# Altium footprint library KwantLib.PcbLib: 249 footprints (part 15 of 16)
Each footprint in its own frame and in the unit in brackets; x right, y up, seen from the top. Pads: shape width x height; smd on the part's side, far side on the other; paste and mask are expansions set on the pad; w line width, h text height; cw(c..) or ccw(c..) is an arc to the next point about the centre after c.
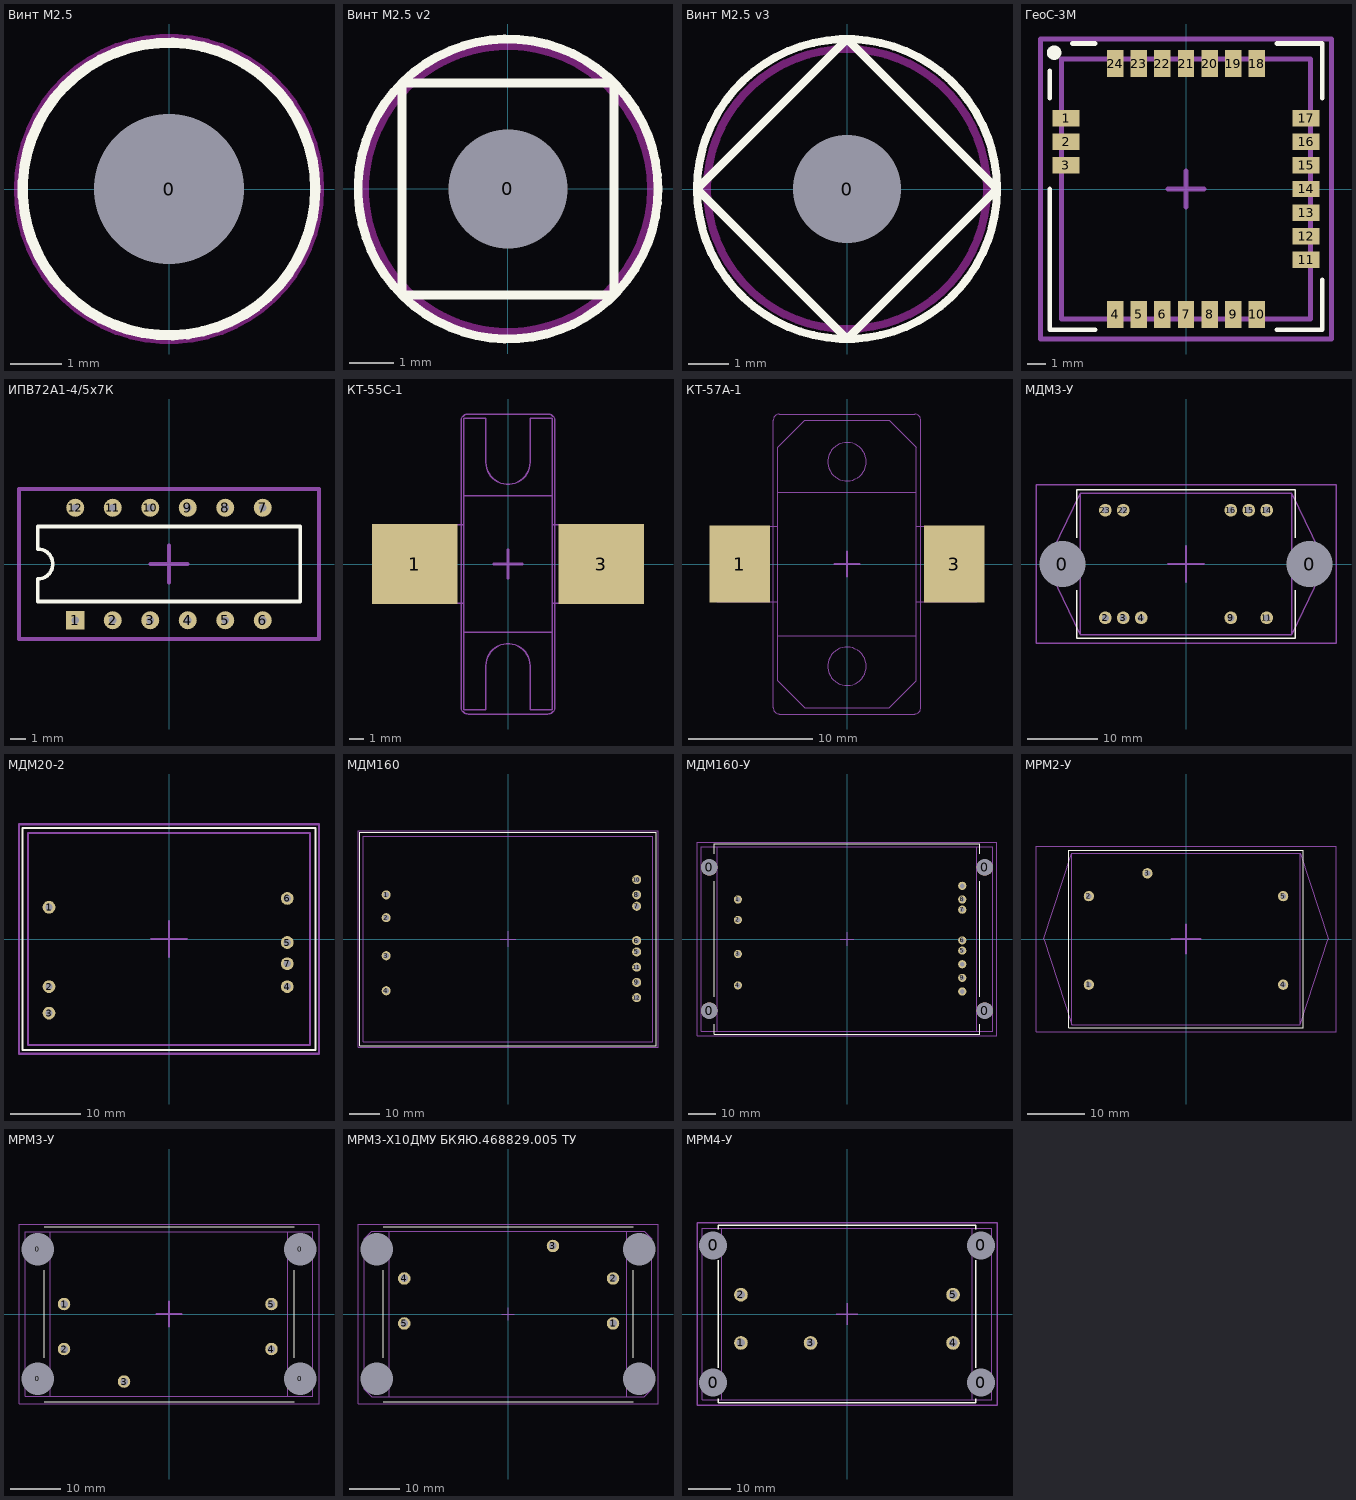
[diagram p14: the footprints below, top view; thin cyan lines are the x and y axes]

## WSON6-Big [mm]
height 0.8

## Винт М2.5 [mm] "Винт М2.5"
height 1.5
pads (1):
  round 2 hole 2.9 unplated: 0(0,0)
Top Overlay:
  circle w0.2: c0,0 r2.828
Keep-Out Layer:
  circle w0.2: c0,0 r2.9

## Винт М2.5 v2 [mm] "Винт М2.5, внутренний 2.7, внешний 6.5мм"
height 1.5
pads (1):
  round 2 hole 2.7 unplated: 0(0,0)
Top Overlay:
  circle w0.2: c0,0 r3.4
  lines w0.2: -2.404,-2.404 2.404,-2.404 2.404,2.404 -2.404,2.404 -2.404,-2.404
Keep-Out Layer:
  circle w0.2: c0,0 r3.25

## Винт М2.5 v3 [mm] "Винт М2.5, внутренний 2.7, внешний 7.5мм"
height 1.5
pads (1):
  round 2 hole 2.7 unplated: 0(0,0)
Top Overlay:
  circle w0.2: c0,0 r3.75
  lines w0.2: -3.75,0 0,3.75 3.75,0 0,-3.75 -3.75,0
Keep-Out Layer:
  circle w0.2: c0,0 r3.5

## ГеоС-3М [mm] "GPS - Glonass module"
pads (24):
  rect 1.5x0.9 smd: 1(-6.6,3.9) 2(-6.6,2.6) 3(-6.6,1.3) 11(6.6,-3.9) 12(6.6,-2.6) 13(6.6,-1.3) 14(6.6,0) 15(6.6,1.3) 16(6.6,2.6) 17(6.6,3.9)
  rect 0.9x1.5 smd: 4(-3.9,-6.9) 5(-2.6,-6.9) 6(-1.3,-6.9) 7(0,-6.9) 8(1.3,-6.9) 9(2.6,-6.9) 10(3.9,-6.9) 18(3.9,6.9) 19(2.6,6.9) 20(1.3,6.9) 21(0,6.9) 22(-1.3,6.9) 23(-2.6,6.9) 24(-3.9,6.9)
Top Overlay:
  circle w0.4: c-7.25,7.5 r0.2
  lines w0.254: -7.5,0 -7.5,-7.75 -5,-7.75 ; -7.5,5 -7.5,6.5 ; -6.25,8 -5,8 ; 5,-7.75 7.5,-7.75 7.5,-5 ; 5,8 7.5,8 7.5,5
Mechanical 13:
  lines w0.254: -6.85,-7.15 -6.85,7.15 6.85,7.15 6.85,-7.15 -6.85,-7.15
Mechanical 15:
  lines w0.254: -1,0 1,0 ; 0,-1 0,1 ; -8,-8.25 -8,8.25 8,8.25 8,-8.25 -8,-8.25
3D body "geos-3m_3d.step": height 2.65, standoff -0.04, extent -6.85,-7.15 6.85,7.15

## ИПВ72А1-4/5х7К [mm]
height 6
pads (12):
  rect 1.2x1.2 hole 0.5 unplated: 1(-6.25,-3.75)
  round 1.2 hole 0.5 unplated: 2(-3.75,-3.75) 3(-1.25,-3.75) 4(1.25,-3.75) 5(3.75,-3.75) 6(6.25,-3.75) 7(6.25,3.75) 8(3.75,3.75) 9(1.25,3.75) 10(-1.25,3.75) 11(-3.75,3.75) 12(-6.25,3.75)
Top Overlay:
  lines w0.25: -8.75,-2.5 -8.75,-1 ccw(c-8.75,0) -8.75,1 -8.75,2.5 8.75,2.5 8.75,-2.5 -8.75,-2.5
Mechanical 13:
  lines w0.25: -10,-5 10,-5 10,5 -10,5 -10,-5
Mechanical 15:
  lines w0.25: -1.25,0 1.25,0 ; 0,-1.25 0,1.25 ; -10,-5 10,-5 10,5 -10,5 -10,-5
3D body: height 6, standoff 0.01, extent -10,-5 10,5

## КТ-55С-1 [mm]
pads (2):
  rect 6x5.6 smd mask+0.07: 1(-6.55,0) 3(6.55,0)
Mechanical 13:
  lines w0.1: -3.1,-2.775 -9,-2.775 -9,2.775 -3.1,2.775 ; 3.1,-2.775 9,-2.775 9,0.025 6.25,2.775 3.1,2.775 ; -3.1,-4.8 -3.1,4.8 ; -3.1,-4.8 3.1,-4.8 ; -3.1,-4.8 -3.1,-10.25 -1.55,-10.25 -1.55,-7.15 cw(c0,-7.15) 1.55,-7.15 1.55,-10.25 3.1,-10.25 3.1,-4.8 ; -3.1,4.8 3.1,4.8 ; -3.1,4.8 -3.1,10.25 -1.55,10.25 -1.55,7.15 ccw(c0,7.15) 1.55,7.15 1.55,10.25 3.1,10.25 3.1,4.8 ; 3.1,-4.8 3.1,4.8
Mechanical 15:
  lines w0.1: -3.3,-10.05 ccw(c-2.8,-10.05) -2.8,-10.55 2.8,-10.55 ccw(c2.8,-10.05) 3.3,-10.05 3.3,10.05 ccw(c2.8,10.05) 2.8,10.55 -2.8,10.55 ccw(c-2.8,10.05) -3.3,10.05 -3.3,-10.05
  lines w0.2: -1,0 1,0 ; 0,-1 0,1
3D body "2П986А.stp": height 2.2, standoff -2.3, extent -9,-10.25 9,10.25

## КТ-57A-1 [mm]
pads (2):
  rect 4.9x6.2 smd mask+0.07: 1(-8.65,0) 3(8.65,0)
Mechanical 13:
  circle w0.1: c0,8.25 r1.55
  circle w0.1: c0,-8.25 r1.55
  lines w0.1: -5.6,-3.05 -10.5,-3.05 -10.5,3.05 -5.6,3.05 ; 5.6,-3.05 10.5,-3.05 10.5,2.05 9.5,3.05 5.6,3.05 ; -5.6,-5.8 5.6,-5.8 ; -5.6,-5.8 -5.6,5.8 ; -5.6,-5.8 -5.6,-9.4 -3.4,-11.6 3.4,-11.6 5.6,-9.4 5.6,-5.8 ; -5.6,5.8 5.6,5.8 ; -5.6,5.8 -5.6,9.4 -3.4,11.6 3.4,11.6 5.6,9.4 5.6,5.8 ; 5.6,-5.8 5.6,5.8
Mechanical 15:
  lines w0.1: -5.95,-11.6 ccw(c-5.45,-11.6) -5.45,-12.1 5.45,-12.1 ccw(c5.45,-11.6) 5.95,-11.6 5.95,11.6 ccw(c5.45,11.6) 5.45,12.1 -5.45,12.1 ccw(c-5.45,11.6) -5.95,11.6 -5.95,-11.6
  lines w0.2: -1,0 1,0 ; 0,-1 0,1
3D body "2П986Г.stp": height 2.7, standoff -3.1, extent -10.5,-11.6 10.5,11.6

## МДМ3-У [mm]
height 8
pads (12):
  round 5 hole 6.5 unplated: 0(-17.5,0) 0(17.5,0)
  round 1.8 hole 1: 2(-11.43,-7.62) 3(-8.89,-7.62) 4(-6.35,-7.62) 9(6.35,-7.62) 11(11.43,-7.62) 14(11.43,7.62) 15(8.89,7.62) 16(6.35,7.62) 22(-8.89,7.62) 23(-11.43,7.62)
Top Overlay:
  lines w0.2: -15.5,-3.75 -15.5,-10.5 15.5,-10.5 15.5,-3.75 ; -15.5,3.75 -15.5,10.5 15.5,10.5 15.5,3.75
Mechanical 13:
  circle w0.2: c17.5,0 r1.5
  circle w0.2: c-17.5,0 r1.5
  lines w0.1: -19.25,0 -15.75,0 ; -17.5,-1.75 -17.5,1.75 ; 15.75,0 19.25,0 ; 17.5,-1.75 17.5,1.75
  lines w0.2: -15,-10 15,-10 ; -15,-10 -19.764,0 -15,10 ; -15,-10 -15,10 ; -15,10 15,10 ; 15,-10 19.764,0 15,10 ; 15,-10 15,10
Mechanical 15:
  lines w0.2: -21.25,-11.25 -21.25,11.25 21.25,11.25 21.25,-11.25 -21.25,-11.25
  lines w0.35: -2.5,0 2.5,0 ; 0,-2.5 0,2.5
3D body "МДМ3.stp": height 8.1, standoff -3.4, extent -19.764,-10 19.764,10

## МДМ20-2 [mm]
height 9
pads (7):
  round 1.8 hole 1 unplated: 1(-17,4.5) 2(-17,-6.75) 3(-17,-10.5) 4(16.75,-6.75) 5(16.75,-0.5) 6(16.75,5.75) 7(16.75,-3.5)
Top Overlay:
  lines w0.3: -20.75,-15.75 20.75,-15.75 20.75,15.75 -20.75,15.75 -20.75,-15.75
Mechanical 13:
  lines w0.3: -20,-15 20,-15 20,15 -20,15 -20,-15
Mechanical 15:
  lines w0.3: -21.25,-16.25 21.25,-16.25 21.25,16.25 -21.25,16.25 -21.25,-16.25
  lines w0.35: -2.5,0 2.5,0 ; 0,-2.5 0,2.5
3D body "МДМ10-2Е0512ВП.stp": height 9.1, standoff -2.9, extent -20,-15 20,15

## МДМ160 [mm]
height 12.7
pads (12):
  round 3 hole 1.8 unplated: 1(-40,14.5) 2(-40,7) 3(-40,-5.5) 4(-40,-17) 5(42.25,-4.25) 6(42.25,-0.5) 7(42.25,10.75) 8(42.25,14.5) 9(42.25,-14.25) 10(42.25,19.5) 11(42.25,-9.25) 12(42.25,-19.25)
Top Overlay:
  lines w0.3: -48.75,-35 -48.75,35 48.75,35 48.75,-35 -48.75,-35
Mechanical 13:
  lines w0.3: -47.5,-33.75 -47.5,33.75 47.5,33.75 47.5,-33.75 -47.5,-33.75
Mechanical 15:
  lines w0.3: -49.25,-35.5 -49.25,35.5 49.25,35.5 49.25,-35.5 -49.25,-35.5
  lines w0.35: -2.5,0 2.5,0 ; 0,-2.5 0,2.5
3D body "МДМ160-1Е48ВП.stp": height 12.8, standoff -2.9, extent -47.5,-33.75 47.5,33.75

## МДМ160-У [mm]
height 12.7
pads (16):
  round 6 hole 6 unplated: 0(-50.5,-26.25) 0(-50.5,26.25) 0(50.5,-26.25) 0(50.5,26.25)
  round 3 hole 1.8: 1(-40,14.5) 2(-40,7) 3(-40,-5.5) 4(-40,-17) 5(42.25,-4.25) 6(42.25,-0.5) 7(42.25,10.75) 8(42.25,14.5) 9(42.25,-14.25) 10(42.25,19.5) 11(42.25,-9.25) 12(42.25,-19.25)
Top Overlay:
  lines w0.3: -48.75,-31.25 -48.75,-35 48.75,-35 48.75,-31.25 ; -48.75,-21.25 -48.75,21.25 ; -48.75,31.25 -48.75,35 48.75,35 48.75,31.25 ; 48.75,-21.25 48.75,21.25
Mechanical 13:
  circle w0.3: c50.5,-26.25 r1.6
  circle w0.3: c50.5,26.25 r1.6
  circle w0.3: c-50.5,26.25 r1.6
  circle w0.3: c-50.5,-26.25 r1.6
  lines w0.3: -47.5,-33.75 -53.5,-33.75 -53.5,33.75 -47.5,33.75 ; -47.5,-33.75 -47.5,33.75 ; -47.5,-33.75 47.5,-33.75 ; -47.5,33.75 47.5,33.75 ; 47.5,-33.75 53.5,-33.75 53.5,33.75 47.5,33.75 ; 47.5,-33.75 47.5,33.75
Mechanical 15:
  lines w0.3: -55,-35.5 -55,35.5 55,35.5 55,-35.5 -55,-35.5
  lines w0.35: -2.5,0 2.5,0 ; 0,-2.5 0,2.5
3D body "МДМ160-1Е48ВУП.stp": height 12.8, standoff -2.9, extent -53.5,-33.75 53.5,33.75

## МРМ2-У [mm]
height 10
pads (5):
  round 1.8 hole 1 unplated: 1(-17,-8) 2(-17,7.5) 3(-6.75,11.5) 4(17,-8) 5(17,7.5)
Top Overlay:
  lines w0.2: -20.5,-15.5 -20.5,15.5 20.5,15.5 20.5,-15.5 -20.5,-15.5
Mechanical 13:
  lines w0.2: -20,-15 -24.88,0 -20,15 ; -20,-15 20,-15 ; -20,-15 -20,15 ; -20,15 20,15 ; 20,-15 24.88,0 20,15 ; 20,-15 20,15
Mechanical 15:
  lines w0.2: -26.25,-16.25 26.25,-16.25 26.25,16.25 -26.25,16.25 -26.25,-16.25
  lines w0.35: -2.5,0 2.5,0 ; 0,-2.5 0,2.5
3D body "МРМ2-В5ДМУ.stp": height 10.1, standoff -2.9, extent -24.88,-15 24.88,15

## МРМ3-У [mm]
height 10
pads (9):
  round 1.8 hole 6.5 unplated: 0(-26.25,-13) 0(-26.25,13) 0(26.25,-13) 0(26.25,13)
  round 2.5 hole 1.5: 1(-21,2) 2(-21,-7) 3(-9,-13.5) 4(20.5,-7) 5(20.5,2)
Top Overlay:
  lines w0.2: -25,-17.5 25,-17.5 ; -25,-8.75 -25,8.75 ; -25,17.5 25,17.5 ; 25,-8.75 25,8.75
Mechanical 13:
  circle w0.2: c26.25,-13 r1.5
  circle w0.2: c26.25,13 r1.5
  circle w0.2: c-26.25,13 r1.5
  circle w0.2: c-26.25,-13 r1.5
  lines w0.1: -28,-13 -24.5,-13 ; -28,13 -24.5,13 ; -26.25,-14.75 -26.25,-11.25 ; -26.25,11.25 -26.25,14.75 ; 24.5,-13 28,-13 ; 24.5,13 28,13 ; 26.25,-14.75 26.25,-11.25 ; 26.25,11.25 26.25,14.75
  lines w0.2: -23.75,-16.5 -28.75,-16.5 -28.75,16.5 -23.75,16.5 ; -23.75,-16.5 23.75,-16.5 ; -23.75,-16.5 -23.75,16.5 ; -23.75,16.5 23.75,16.5 ; 23.75,-16.5 28.75,-16.5 28.75,16.5 23.75,16.5 ; 23.75,-16.5 23.75,16.5
Mechanical 15:
  lines w0.2: -30,-18 30,-18 30,18 -30,18 -30,-18
  lines w0.35: -2.5,0 2.5,0 ; 0,-2.5 0,2.5
3D body "МРМ3-Д10ДМУ.stp": height 10, standoff -3, extent -28.75,-16.5 28.75,16.5

## МРМ3-Х10ДМУ БКЯЮ.468829.005 ТУ [mm] "Фильтр помехоподавляющий"
height 10.2
pads (9):
  round 2.5 hole 1.5: 1(21,-1.9) 2(21,7.1) 3(9,13.6) 4(-20.75,7.1) 5(-20.75,-1.9)
  round 1.8 hole 6.5 unplated: MH0(-26.25,-13) MH0(-26.25,13) MH0(26.25,-13) MH0(26.25,13)
Top Overlay:
  lines w0.2: -25,-17.5 25,-17.5 ; -25,-8.75 -25,8.75 ; -25,17.5 25,17.5 ; 25,-8.75 25,8.75
Mechanical 13:
  lines w0.2: -23.75,-16.6 -23.75,16.6 ; -23.75,-16.6 -27.25,-16.6 -28.75,-15.1 -28.75,15.1 -27.25,16.6 -23.75,16.6 ; -23.75,-16.6 23.75,-16.6 ; -23.75,16.6 23.75,16.6 ; 23.75,-16.6 23.75,16.6 ; 23.75,-16.6 27.25,-16.6 28.75,-15.1 28.75,15.1 27.25,16.6 23.75,16.6
Mechanical 15:
  lines w0.1: -1.25,0 1.25,0 ; 0,-1.25 0,1.25
  lines w0.2: -30,-18 -30,18 30,18 30,-18 -30,-18
3D body "Фильтр помехоподавляющий МРМ3-Д10ДМУ _ БКЯЮ.468829.005 ТУ_.stp": height 10.2, standoff -6, extent -28.75,-16.6 28.75,16.61

## МРМ4-У [mm]
height 10
pads (9):
  round 5 hole 6.5 unplated: 0(-31.25,-16) 0(-31.25,16) 0(31.25,-16) 0(31.25,16)
  round 3.2 hole 2: 1(-24.75,-6.75) 2(-24.75,4.5) 3(-8.5,-6.75) 4(24.75,-6.75) 5(24.75,4.5)
Top Overlay:
  lines w0.3: -30,-19.75 -30,-20.75 30,-20.75 30,-19.75 ; -30,-12.5 -30,12.5 ; -30,19.75 -30,20.75 30,20.75 30,19.75 ; 30,-12.5 30,12.5
Mechanical 13:
  circle w0.2: c31.25,16 r1.35
  circle w0.2: c31.25,-16 r1.35
  circle w0.2: c-31.25,16 r1.35
  circle w0.2: c-31.25,-16 r1.35
  lines w0.1: -33,-16 -29.5,-16 ; -33,16 -29.5,16 ; -31.25,-17.75 -31.25,-14.25 ; -31.25,14.25 -31.25,17.75 ; 29.5,-16 33,-16 ; 29.5,16 33,16 ; 31.25,-17.75 31.25,-14.25 ; 31.25,14.25 31.25,17.75
  lines w0.2: -29.25,-20 29.25,-20 ; -29.25,-20 -29.25,20 ; -29.25,-20 -33.75,-20 -33.75,20 -29.25,20 ; -29.25,20 29.25,20 ; 29.25,-20 29.25,20 ; 29.25,-20 33.75,-20 33.75,20 29.25,20
Mechanical 15:
  lines w0.3: -35,-21.25 -35,21.25 35,21.25 35,-21.25 -35,-21.25
  lines w0.35: -2.5,0 2.5,0 ; 0,-2.5 0,2.5
3D body "МРМ4-В20ДМУ.stp": height 10.1, standoff -2.9, extent -33.75,-20 33.75,20